# Altium integrated library Electro-Mech.IntLib: 140 symbols (continued)
## MIC-POM-2246P-C33-R_THP
designator MIC?, comment Part Number: POM-2246P-C33-R  (hidden comment: MIC-POM-2246P-C33-R)
Microphone 2-10V 0.5mA; Manufacturer: PUIAUDIO; Package: POM-2246P-C33-R; EDM-PN: *; Text2: *; Text1: *; Value: POM-2246P-C33-R
footprint POM-2246P-C33-R (POM-2246P-C33-R 6.0x6.0mm)
pins: 1 +, 2 -

## MIC-RS 724-3134
designator MIC?, comment RS 724-3134
Microphone 1.5-10V; Manufacturer: RS; Package: MIC-RS 724-3134; EDM-PN: *; Text2: *; Text1: *; Value: RS 724-3134; Part Number: RS 724-3134
footprint MIC-CMA-6542PF (CMA-6542PF 9.7x9.7mm)
pins: 1 +, 2 -

## MIC-WP-23501-000
designator MIC?, comment WP-23501-000
Microphone Electret Condenser 1.3V - 10V Noise Cancelling; Manufacturer: knowles; EDM-PN: MIC18; Package: MIC-WP-23501-000; Text2: *; Text1: *; Value: WP-23501-000; Part Number: WP-23501-000
footprint MIC-WP-23501-000 (WP-23501-000 5.56x3.99mm)
pins: 1 POS, 2 SIG, 3 NEG

## MIC-WP-23501-000-Body-2mm
designator MIC?, comment WP-23501-000  (mechanical)
Microphone Electret Condenser 1.3V - 10V Noise Cancelling; Manufacturer: knowles; EDM-PN: MIC18; Package: MIC-WP-23501-000; Text2: *; Text1: *; Value: WP-23501-000; Part Number: WP-23501-000
footprint MIC-WP-23501-000-2MM (WP-23501-000 5.56x3.99mm)
text: 1-POS; 2-SIG; 3-NEG

## Motor-316040005
designator MOT?, comment 316040005
Motor Vibration 1.3V; Manufacturer: Seeed; Package: Motor-316040005; EDM-PN: *; Text2: *; Text1: *; Value: 316040005; Part Number: 316040005
footprint Motor-316040005 (316040005 14.2x6.6mm)
pins: 1, 2, 3 B, 4 B
text: MOT

## Motor-C1026B002F
designator MOT?  Part Number: C1026B002F  (hidden comment: Motor-C1026B002F)
Motor Vibration 3.0V; Manufacturer: JinLong Machinery; Package: VIB-C1026B002F; EDM-PN: *; Text2: *; Text1: *; Value: C1026B002F
footprint VIB-C1026B002F (C1026B002F 10.0x10.0mm)
pins: 1 +, 2 -
text: MOT

## Motor-KHN4NX1RC
designator MOT?  Part Number: KHN4NX1RC  (hidden comment: Motor-KHN4NX1RC)
Motor Vibration 1.3V; Manufacturer: NMB-MAT; Package: MOT-KHN4NX; EDM-PN: *; Text2: *; Text1: *; Value: KHN4NX1RC
footprint MOT-KHN4NX (KHN4NX1RC 15.5x4.5mm)
pins: 1, 2, 3 B
text: MOT

## Motor-Z4NC1A1591901
designator MOT?  Part Number: Z4NC1A1591901  (hidden comment: Motor-Z4NC1A1591901)
Motor Vibration 1.3V; Manufacturer: KOTL; Package: MOT-Z4NC1A1591901; EDM-PN: *; Text2: *; Text1: *; Value: Z4NC1A1591901
footprint MOT-Z4NC1A1591901 (Z4NC1A1591901 12.8x4.5mm)
pins: 1, 2, 3 B
text: MOT

## Motor-Z4NC1A1591901-MOD
designator MOT?  value Z4NC1A1591901-MOD  (hidden comment: Motor-Z4NC1A1591901-MOD)
Motor Vibration 1.3V; Manufacturer: KOTL; Package: MOT-Z4NC1A1591901; EDM-PN: *; Text2: *; Text1: *; Part Number: Z4NC1A1591901
footprint MOT-Z4NC1A1591901-MOD (Z4NC1A1591901 12.8x4.5mm)
pins: 1, 2, 3 B
text: MOT

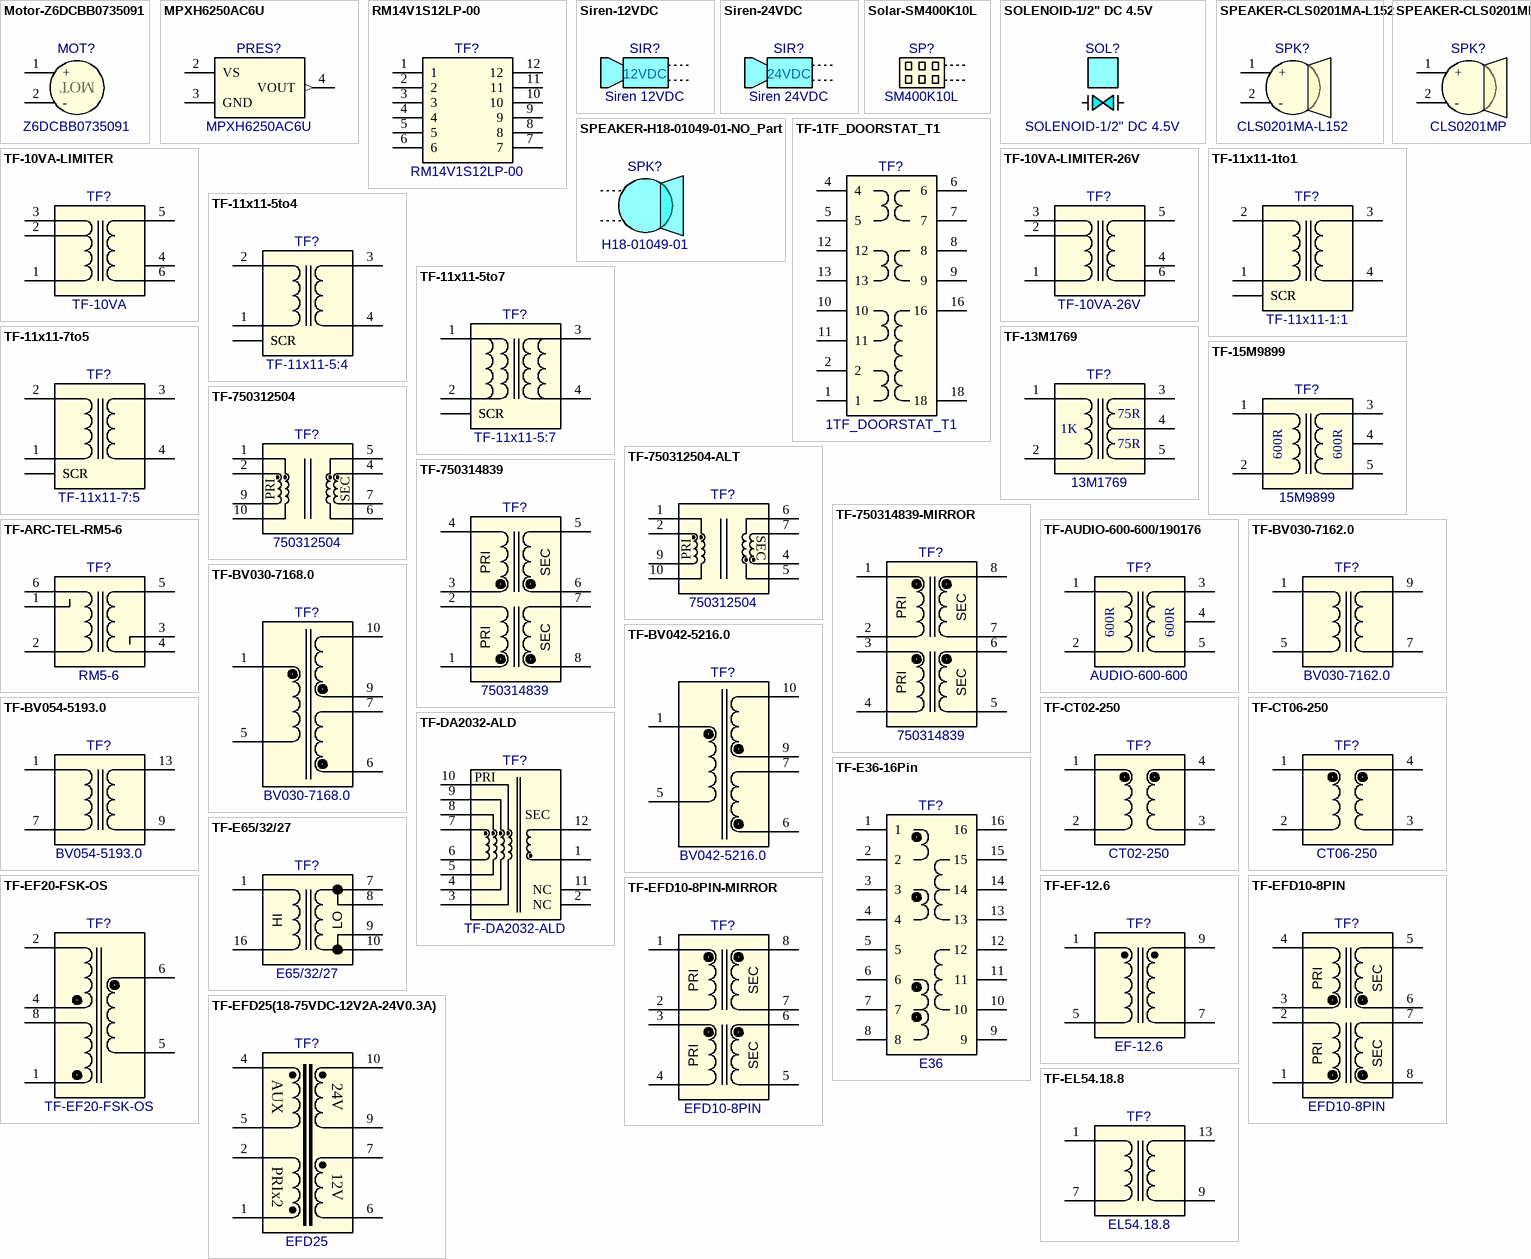
[diagram p2: symbols Motor-Z6DCBB0735091 to TF-EL54.18.8]

## Motor-Z6DCBB0735091
designator MOT?, comment Z6DCBB0735091
Motor Vibration 3.0V; Manufacturer: JinLong Machinery; Package: Motor-Z6DCBB0735091; EDM-PN: *; Text2: *; Text1: *; Value: Z6DCBB0735091; Part Number: Z6DCBB0735091
footprint Motor-Z6DCBB0735091 (Z6DCBB0735091 18.8x6.8mm)
pins: 1 +, 2 -
text: MOT

## MPXH6250AC6U
designator PRES?
Presuure Sensor 20 to 250kPa; Manufacturer: Freescale; Package: SSOP-1317A-03; EDM-PN: *; Text2: *; Text1: *; Value: MPXH6250AC6U; Part Number: MPXH6250AC6U
footprint SSOP-1317A-03 (Variable Resistor, BI Technologies, Straight SMD)
pins: 2 VS (power), 3 GND (power), 4 VOUT (out)

## RM14V1S12LP-00
designator TF?
Transformer RM14; Manufacturer: Miles-Platts; Package: TRM14-12-DIL; EDM-PN: *; Text2: *; Text1: *; Value: RM14V1S12LP-00; Part Number: RM14V1S12LP-00
footprint RM14-12-DIL (RM14 12 Pin 31.4x35.56mm)
pins: 1, 2, 3, 4, 5, 6, 7, 8, 9, 10, 11, 12

## Siren-12VDC
designator SIR?  value 12VDC  (hidden comment: Siren-12VDC)  (mechanical)
Siren 12VDC; Manufacturer: Various; Package: NA; EDM-PN: *; Text2: *; Text1: *; Part Number: Siren 12VDC

## Siren-24VDC
designator SIR?  value 24VDC  (hidden comment: Siren-24VDC)  (mechanical)
Siren 24VDC; Manufacturer: Various; Package: NA; EDM-PN: *; Text2: *; Text1: *; Part Number: Siren 24VDC

## Solar-SM400K10L
designator SP?, comment SM400K10L
Siren 24VDC; Manufacturer: IXYS; Package: SOLAR-SM400K10L; EDM-PN: *; Text2: *; Text1: *; Part Number: SM400K10L; Value: SM400K10L
footprint SOLAR-SM400K10L (SM400K10L 33.0x15.0mm)

## SOLENOID-1/2" DC 4.5V
designator SOL?  (mechanical)
Solenoid Valve 1/2" DC 4.5V; Manufacturer: Various; Package: NA; EDM-PN: *; Text2: *; Text1: *; Value: SOLENOID-1/2" DC 4.5V; Part Number: SOLENOID-1/2" DC 4.5V

## SPEAKER-CLS0201MA-L152
designator SPK?, comment CLS0201MA-L152
Speaker 8 Ohm 500mW; Manufacturer: CUI; Package: SPK-CLS0201MA-L152; EDM-PN: *; Text2: *; Text1: *; Value: CLS0201MA-L152; Part Number: CLS0201MA-L152
footprint SPK-CLS0201MA-L152 (CLS0201MA-L152 20x20mm)
pins: 1 +, 2 -

## SPEAKER-CLS0201MP
designator SPK?, comment CLS0201MP
Speaker 8 Ohm 100mW; Manufacturer: CUI; Package: SPK-CLS0201MP; EDM-PN: *; Text2: *; Text1: *; Value: CLS0201MP; Part Number: CLS0201MP
footprint SPK-CLS0201MP (CLS0201MP 20x20mm)
pins: 1 +, 2 -

## SPEAKER-H18-01049-01-NO_Part
designator SPK?, comment H18-01049-01  (mechanical)
Speaker 16 Ohm 3mW; Manufacturer: Shenzhenshi Hite Sound; EDM-PN: SPK7; Package: NA; Text2: *; Text1: *; Value: H18-01049-01; Part Number: H18-01049-01

## TF-1TF_DOORSTAT_T1
designator TF?  value 1TF_DOORSTAT_T1  (hidden comment: TF-1TF_DOORSTAT_T1)
Transformer 1TF_Doorstat_T1; Manufacturer: DJC Systems; Package: TF-ETD44-Dooralarm; EDM-PN: *; Text2: *; Text1: *; Part Number: 1TF_DOORSTAT_T1
footprint TF-ETD44-Dooralarm
pins: 1, 2, 4, 5, 6, 7, 8, 9, 10, 11, 12, 13, 16, 18

## TF-10VA-LIMITER
designator TF?  value TF-10VA  (hidden comment: TF-10VA-LIMITER)
Transformer PCB Mount 10VA; Manufacturer: Owner; Package: TF-10VA-74x47x39-6Pin(LIM); EDM-PN: *; Text2: *; Text1: *; Part Number: TF-10VA-LIMITER
footprint TF-10VA-74x47x39-6Pin(LIM) (TF-10VA 74.0x47.0mm)
pins: 1, 2, 3, 4, 5, 6

## TF-10VA-LIMITER-26V
designator TF?  value TF-10VA-26V  (hidden comment: TF-10VA-LIMITER-26V)
Transformer PCB Mount 10VA 26V; Manufacturer: Owner; Part Number: TF-10VA-LIMITER 26V; Package: TF-10VA-74x47x39-6Pin(LIM); EDM-PN: *; Text2: *; Text1: *
footprint TF-10VA-74x47x39-6Pin(LIM) (TF-10VA 74.0x47.0mm)
pins: 1, 2, 3, 4, 5, 6

## TF-11x11-1to1
designator TF?  value TF-11x11-1:1  (hidden comment: TF-11x11-1to1)
Transformer 1:1; Manufacturer: Owner; Package: TF 11X11-4PIN; EDM-PN: *; Text2: *; Text1: *; Part Number: TF-11x11-1:1
footprint TF 11X11-4PIN (Transformer 11x11mm)
pins: 1, 2, 3, 4, M1 SCR, M2 SCR

## TF-11x11-5to4
designator TF?  value TF-11x11-5:4  (hidden comment: TF-11x11-5to4)
Transformer 5:4; Manufacturer: Owner; Package: TF 11X11-4PIN; EDM-PN: *; Text2: *; Text1: *; Part Number: TF-11x11-5:4
footprint TF 11X11-4PIN (Transformer 11x11mm)
pins: 1, 2, 3, 4, M1 SCR, M2 SCR

## TF-11x11-5to7
designator TF?  value TF-11x11-5:7  (hidden comment: TF-11x11-5to7)
Transformer 5:7 Dual Coil; Manufacturer: Owner; Package: TF 11X11-4PIN-11; EDM-PN: *; Text2: *; Text1: *; Part Number: TF-11x11-5:7
footprint TF 11X11-4PIN-11 (Transformer 11x11mm)
pins: 1, 2, 3, 4, M1 SCR, M2 SCR

## TF-11x11-7to5
designator TF?  value TF-11x11-7:5  (hidden comment: TF-11x11-7to5)
Transformer 7:5; Manufacturer: Owner; Package: TF 11X11-4PIN; EDM-PN: *; Text2: *; Text1: *; Part Number: TF-11x11-7:5
footprint TF 11X11-4PIN (Transformer 11x11mm)
pins: 1, 2, 3, 4, M1 SCR, M2 SCR

## TF-13M1769
designator TF?, comment 13M1769
Transformer Audio Impedance match; Manufacturer: Mantech; EDM-PN: TRF31; Package: TF-88-900; Text2: *; Text1: *; Part Number: 13M1769; Value: 13M1769
footprint TF-88-900 (88-900)
pins: 1, 2, 3, 4, 5
text: 75R; 1K

## TF-15M9899
designator TF?, comment 15M9899
Transformer Audio Impedance Match 600/600R; Manufacturer: Mantech/EIE; Part Number: 15M9899/190176; EDM-PN: TRF30; Package: TF-88-900; Text2: *; Text1: *; Value: 15M9899
footprint TF-88-900 (88-900)
pins: 1, 2, 3, 4, 5
text: 600R

## TF-750312504
designator TF?, comment 750312504
Transformer Flyback 1:1 3.0uH 10.8A; Manufacturer: Wurth; Package: TF-750312504; EDM-PN: *; Text2: *; Text1: *; Value: 750312504; Part Number: 750312504
footprint TF-750312504 (750312504 13.46x13.46mm)
pins: 1, 2, 4, 5, 6, 7, 9, 10
text: PRI; SEC

## TF-750312504-ALT
designator TF?, comment 750312504
Transformer Flyback 1:1 3.0uH 10.8A; Manufacturer: Wurth; Package: TF-750312504; EDM-PN: *; Text2: *; Text1: *; Value: 750312504; Part Number: 750312504
footprint TF-750312504 (750312504 13.46x13.46mm)
pins: 1, 2, 4, 5, 6, 7, 9, 10
text: PRI; SEC

## TF-750314839
designator TF?, comment 750314839
Transformer Converters For DC/DC; Manufacturer: Wurth; Package: TF-750314839; EDM-PN: *; Text2: *; Text1: *; Part Number: 750314839; Value: 750314839
footprint TF-750314839 (750314839 9.14x9.78mm)
pins: 1, 2, 3, 4, 5, 6, 7, 8
text: PRI; SEC

## TF-750314839-MIRROR
designator TF?, comment 750314839
Transformer Converters For DC/DC; Manufacturer: Wurth; Package: TF-750314839; EDM-PN: *; Text2: *; Text1: *; Part Number: 750314839; Value: 750314839
footprint TF-750314839 (750314839 9.14x9.78mm)
pins: 1, 2, 3, 4, 5, 6, 7, 8
text: PRI; SEC

## TF-ARC-TEL-RM5-6
designator TF?  value RM5-6  (hidden comment: TF-ARC-TEL-RM5-6)
Transformer PCB Mount RM5 6 Pin; Manufacturer: Arc-Tel; Package: TF-RM5-6Pin; EDM-PN: *; Text2: *; Text1: *; Part Number: TF-ARC-TEL-RM5-6
footprint TF-RM5-6Pin
pins: 1, 2, 3, 4, 5, 6

## TF-AUDIO-600-600/190176
designator TF?, comment value AUDIO-600-600  (hidden comment: AUDIO-600-600/190176)
Transformer Audio Impedance Match 600/600R; Manufacturer: Mantech/EIE; EDM-PN: TRF30; Package: TF-88-900; Text2: *; Text1: *; Part Number: AUDIO-600-600/190176
footprint TF-88-900 (88-900)
pins: 1, 2, 3, 4, 5
text: 600R

## TF-BV030-7162.0
designator TF?  value BV030-7162.0  (hidden comment: TF-BV030-7162.0)
Transformer PCB Mount 230V 1x9.0V 1.5VA; Manufacturer: Pulse; Package: TF-1.5VA-27.5x32.5x24-4P; EDM-PN: *; Text2: *; Text1: *; Part Number: BV030-7162.0
footprint TF-1.5VA-27.5x32.5x24-4P (TF-1.5VA 27.5x32.5mm)
pins: 1, 5, 7, 9

## TF-BV030-7168.0
designator TF?  value BV030-7168.0  (hidden comment: TF-BV030-7168.0)
Transformer PCB Mount 230V 2x12.0V 1.5VA; Manufacturer: Pulse; Package: TF-1.5VA-27.5x32.5x24-4P; EDM-PN: *; Text2: *; Text1: *; Part Number: BV030-7168.0
footprint TF-1.5VA-27.5x32.5x24-6P (TF-1.5VA 27.5x32.5mm)
pins: 1, 5, 6, 7, 9, 10

## TF-BV042-5216.0
designator TF?  value BV042-5216.0  (hidden comment: TF-BV042-5216.0)
Transformer PCB Mount 230V 2x12.0V 5VA; Manufacturer: Pulse; Package: TF-El42-5VA; EDM-PN: *; Text2: *; Text1: *; Part Number: BV042-5216.0
footprint TF-EL42-5VA (TF-EL42-5VA 38.5x45.5mm)
pins: 1, 5, 6, 7, 9, 10

## TF-BV054-5193.0
designator TF?  value BV054-5193.0  (hidden comment: TF-BV054-5193.0)
Transformer PCB Mount 230V 1x12.0V 16VA; Manufacturer: Pulse; Package: TF-16VA; EDM-PN: *; Text2: *; Text1: *; Part Number: BV054-5193.0
footprint TF-EL54-16VA (TF-EL54-16VA 48.0x57.0mm)
pins: 1, 7, 9, 13

## TF-CT02-250
designator TF?, comment CT02-250
Transformer Current Sense; Manufacturer: ICE Components; Package: TF-CT02 Series; EDM-PN: *; Text2: *; Text1: *; Part Number: CT02-250; Value: CT02-250
footprint TF-CT02 Series (CT02 6.0x6.4mm)
pins: 1, 2, 3, 4

## TF-CT06-250
designator TF?, comment CT06-250
Transformer Current Sense; Manufacturer: ICE Components; Package: TF-CT06 Series; EDM-PN: *; Text2: *; Text1: *; Part Number: CT06-250; Value: CT06-250
footprint TF-CT06 Series (CT06 6.7x6.5mm)
pins: 1, 2, 3, 4

## TF-DA2032-ALD
designator TF?
Transformer Flyback; Manufacturer: Coilcraft; Package: TF-DA2032-ALD; EDM-PN: *; Text2: *; Text1: *; Value: TF-DA2032-ALD; Part Number: TF-DA2032-ALD
footprint TF-DA2032-ALD (DA2032-ALD 14.98x17.2mm)
pins: 1, 2 NC, 3, 4, 5, 6, 7, 8, 9, 10, 11 NC, 12
text: PRI; SEC

## TF-E36-16Pin
designator TF?  value E36  (hidden comment: TF-E36-16Pin)
Transformer DBEE360020; Manufacturer: Owner; Package: TF-ETD44-Dooralarm; EDM-PN: *; Text2: *; Text1: *; Part Number: E36
footprint TF-E36-16PIN-8+8 (E36 37x38mm)
pins: 1, 2, 3, 4, 5, 6, 7, 8, 9, 10, 11, 12, 13, 14, 15, 16

## TF-E65/32/27
designator TF?, comment E65/32/27
Transformer PCB Mount E65/32/27; Manufacturer: Owner; Package: TF-E65-32-27; EDM-PN: *; Text2: *; Text1: *; Part Number: E65/32/27; Value: E65/32/27
footprint TF-E65-32-27 (E65-32-27 42x49mm)
pins: 1, 7, 8, 9, 10, 16
text: HI; LO

## TF-EF20-FSK-OS
designator TF?
Transformer PCB Mount Offline Switcher; Manufacturer: FSK; Package: TF-EF20-8PIN-X7; EDM-PN: *; Text2: *; Text1: *; Value: TF-EF20-FSK-OS; Part Number: TF-EF20-FSK-OS
footprint TF-EF20-8PIN-X7 (EF20 20.5x20.5mm)
pins: 1, 2, 4, 5, 6, 8

## TF-EF-12.6
designator TF?, comment EF-12.6
Transformer PCB Mount SMD; Manufacturer: Pin Shine; Package: TF-EF12.6-S; EDM-PN: *; Text2: *; Text1: *; Part Number: EF-12.6; Value: EF-12.6
footprint TF-EF12.6-S (EF12.6-S 17.7x13.0mm)
pins: 1, 5, 7, 9

## TF-EFD10-8PIN
designator TF?  value EFD10-8PIN  (hidden comment: TF-EFD10-8PIN)
Transformer Converters For DC/DC; Manufacturer: Owner; Package: TF-EFD10; EDM-PN: *; Text2: *; Text1: *; Part Number: EFD10-8PIN
footprint TF-EFD10 (EFD10)
pins: 1, 2, 3, 4, 5, 6, 7, 8
text: PRI; SEC

## TF-EFD10-8PIN-MIRROR
designator TF?, comment value EFD10-8PIN  (hidden comment: TF-EFD10-8PIN)
Transformer Converters For DC/DC; Manufacturer: Owner; Package: TF-EFD10; EDM-PN: *; Text2: *; Text1: *; Part Number: EFD10-8PIN
footprint TF-EFD10 (EFD10)
pins: 1, 2, 3, 4, 5, 6, 7, 8
text: PRI; SEC

## TF-EFD25(18-75VDC-12V2A-24V0.3A)
designator TF?, comment value EFD25  (hidden comment: EFD25(18-75VDC-12V2A-24V0.3A))
Transformer Fly-Back-32_72kHz; Manufacturer: Microtronix; Package: TF-EFD25-5x5; EDM-PN: *; Text2: *; Text1: *; Part Number: EFD25(18-75VDC-12V2A-24V0.3A)
footprint TF-EFD25-5x5 (EFD25-5x5)
pins: 1 Pa, 2 Pb, 4 S3b, 5 S3a, 6 S1a, 7 S1b, 9 S2b, 10 S2a
text: AUX; 24V; PRIx2; 12V

## TF-EL54.18.8
designator TF?  value EL54.18.8  (hidden comment: TF-EL54.18.8)
Transformer PCB Mount 230V 1x12.0V 16VA; Manufacturer: ERA; Package: TF-16VA; EDM-PN: *; Text2: *; Text1: *; Part Number: EL54.18.8
footprint TF-EL54-16VA (TF-EL54-16VA 48.0x57.0mm)
pins: 1, 7, 9, 13

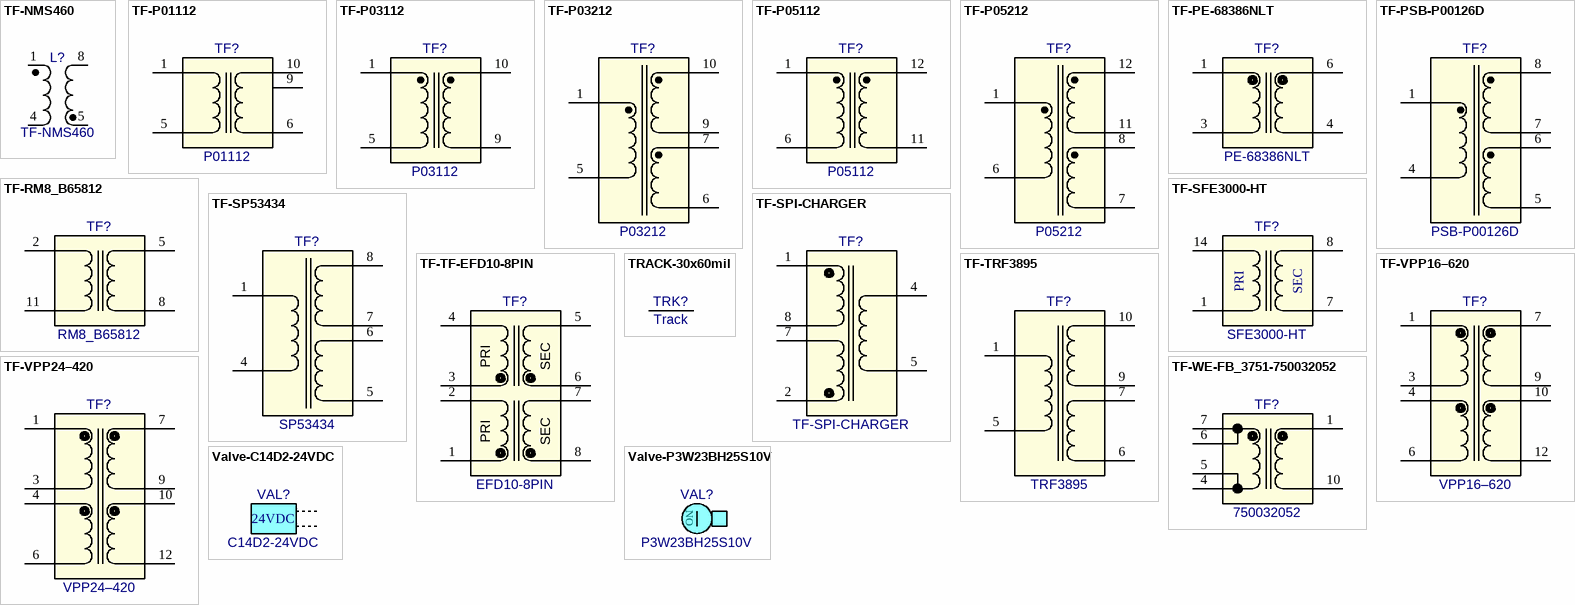
[diagram p3: symbols TF-NMS460 to Valve-P3W23BH25S10V]

## TF-NMS460
designator L?
Transformer NMS460 (EFD15 Core); Manufacturer: Xavant; Part Number: TF-NMS460; Package: TF-NMS460; EDM-PN: *; Text1: *; Text2: EFD15; Value: TF-NMS460
footprint TF-NMS460 (TF NMS460 15.5x15.5mm)
pins: 1 P1, 4 P2, 5 S1, 8 S2

## TF-P01112
designator TF?, comment P01112
Transformer PCB Mount 230V 1x12.0V 1.5VA; Manufacturer: ACDC; Package: TF-1.5VA-27.5x32.5x24-5P; EDM-PN: *; Text2: *; Text1: *; Part Number: P01112; Value: P01112
footprint TF-1.5VA-27.5x32.5x24-5P (TF-1.5VA 27.5x32.5mm)
pins: 1, 5, 6, 9, 10

## TF-P03112
designator TF?  value P03112  (hidden comment: TF-P03112)
Transformer PCB Mount 230V 1x12.0V 3VA; Manufacturer: ACDC; Package: TF-3VA-63x38x33-5pin; EDM-PN: *; Text2: *; Text1: *; Part Number: P03112
footprint TF-3VA-63x38x33-5pin (TF-3VA 63.0x38.0mm)
pins: 1, 5, 9, 10

## TF-P03212
designator TF?  value P03212  (hidden comment: TF-P03212)
Transformer PCB Mount 230V 2x12.0V 3VA; Manufacturer: ACDC; Package: TF-3VA-63x38x33-6pin; EDM-PN: *; Text2: *; Text1: *; Part Number: P03212
footprint TF-3VA-63x38x33-6pin (TF-3VA 63.0x38.0mm)
pins: 1, 5, 6, 7, 9, 10

## TF-P05112
designator TF?  value P05112  (hidden comment: TF-P05112)
Transformer PCB Mount 230V 1x12.0V 5.5VA; Manufacturer: ACDC; Package: TF-5.5VA-69x43x38-5pin; EDM-PN: *; Text2: *; Text1: *; Part Number: P05112
footprint TF-5.5VA-69x43x38-5pin (TF-5.5VA 69.0x43.0mm)
pins: 1, 6, 11, 12

## TF-P05212
designator TF?  value P05212  (hidden comment: TF-P05212)
Transformer PCB Mount 230V 2x12.0V 5.5VA; Manufacturer: ACDC; Package: TF-5.5VA-69x43x38-8pin; EDM-PN: *; Text2: *; Text1: *; Part Number: P05212
footprint TF-5.5VA-69x43x38-8pin (TF-5.5VA 69.0x43.0mm)
pins: 1, 6, 7, 8, 11, 12

## TF-PE-68386NLT
designator TF?, comment PE-68386NLT
Transformer Gate Drive 785uH 1:1; Manufacturer: Pulse; Package: TF-PE-68386NLT; EDM-PN: *; Text2: *; Text1: *; Part Number: PE-68386NLT; Value: PE-68386NLT
footprint TF-PE-68386NLT (PE-68386NLT 8.6x6.73mm)
pins: 1, 3, 4, 6

## TF-PSB-P00126D
designator TF?  value PSB-P00126D  (hidden comment: TF-PSB-P00126D)
Transformer PCB Mount 230V 18+18V 0.6VA; Manufacturer: Premier Magnetics; Package: TF-E20-8PIN-4+4-PSB; EDM-PN: *; Text2: *; Text1: *; Part Number: PSB-P00126D
footprint TF-E20-8PIN-4+4-PSB (E20 24.0x23.0mm)
pins: 1, 4, 5, 6, 7, 8

## TF-RM8_B65812
designator TF?, comment RM8_B65812
Transformer PCB Mount RM8 12 Pin; Manufacturer: Owner; Package: TF-RM8-12P; EDM-PN: *; Text2: *; Text1: *; Part Number: RM8_B65812; Value: RM8_B65812
footprint TF-RM8-12P (RM8 12Pin)
pins: 2, 5, 8, 11

## TF-SFE3000-HT
designator TF?  value SFE3000-HT  (hidden comment: TF-SFE3000-HT)
Transformer PCB Mount; Manufacturer: Owner; Package: TF-ETD34; EDM-PN: *; Text2: *; Text1: *; Part Number: SFE3000-HT
footprint TF-ETD34 (ETD34 39.6x41.8mm)
pins: 1, 7, 8, 14
text: PRI; SEC

## TF-SP53434
designator TF?  value SP53434  (hidden comment: TF-SP53434)
Transformer PCB Mount 230V 15+15V 12VA; Manufacturer: RS; Part Number: 504-678; Package: TF-SP53434; EDM-PN: *; Text2: *; Text1: *
footprint TF-ST53434 (TF SS53434 54.0x45.0mm)
pins: 1, 4, 5, 6, 7, 8

## TF-SPI-CHARGER
designator TF?
Transformer PCB Mount SPI Charger; Manufacturer: SPI; Package: TF-EF20-8PIN; EDM-PN: *; Text2: *; Text1: *; Value: TF-SPI-CHARGER; Part Number: TF-SPI-CHARGER
footprint TF-EF20-8PIN-X3X6 (Transformer EF20 8 Pin PCB Mount - no Pin 3 and 6)
pins: 1, 2, 4, 5, 7, 8

## TF-TF-EFD10-8PIN
designator TF?, comment value EFD10-8PIN  (hidden comment: TF-EFD10-8PIN)
Transformer Converters For DC/DC; Manufacturer: Owner; Package: TF-EFD10; EDM-PN: *; Text2: *; Text1: *; Part Number: EFD10-8PIN
footprint TF-EFD10 (EFD10)
pins: 1, 2, 3, 4, 5, 6, 7, 8
text: PRI; SEC

## TF-TRF3895
designator TF?  value TRF3895  (hidden comment: TF-TRF3895)
Transformer 2VA 50Hz 230/2x17.5V; Manufacturer: Communica; Package: TF-2VA-35x42x28-6P; EDM-PN: *; Text2: *; Text1: *; Part Number: TRF3895
footprint TF-2VA-35x42x28-6P (TF 2VA 35.0x42.0mm)
pins: 1, 5, 6, 7, 9, 10

## TF-VPP16–620
designator TF?, comment VPP16–620
Transformer 230VAC 10VA - 16V 0.62A/2x8V 1.25A; Manufacturer: Triad Magnetics; Package: TF-VPP16–620; EDM-PN: *; Text2: *; Text1: *; Part Number: VPP16–620; Value: VPP16–620
footprint TF-VPP16-620 (VPP16-620 39.67x47.625mm)
pins: 1, 3, 4, 6, 7, 9, 10, 12

## TF-VPP24–420
designator TF?, comment VPP24–420
Transformer 230VAC 10VA - 24V 0.42A/2x12V 0.84A; Manufacturer: Triad Magnetics; Package: TF-VPP24-420; EDM-PN: *; Text2: *; Text1: *; Part Number: VPP24–420; Value: VPP24–420
footprint TF-VPP24-420 (VPP24-420 39.67x47.6mm)
pins: 1, 3, 4, 6, 7, 9, 10, 12

## TF-WE-FB_3751-750032052
designator TF?  value 750032052  (hidden comment: TF-WE-FB_3751-750032052)
Transformer Flyback for LT3751 WE-FB 3751; Manufacturer: Wurth; Package: TF-WE-FB-EFD20; EDM-PN: *; Text2: *; Text1: *; Part Number: 750032052
footprint TF-WE-FB-EFD20 (WE-FB-EFD20 28.7x21.97mm)
pins: 1, 4, 5, 6, 7, 10

## TRACK-30x60mil
designator TRK?, comment Part Number: Track  (hidden comment: Track 30mil)
Presuure Sensor 20 to 250kPa; Manufacturer: NA; Value: Track 30x60mil; Package: TRACK-30X60; EDM-PN: *; Text2: *; Text1: *
footprint TRACK-30x60mil (Track 30mil Wide 60mil Long)
pins: 1, 2

## Valve-C14D2-24VDC
designator VAL?, comment C14D2-24VDC  (mechanical)
Solenoid Coil 24VDC for P3W23/P2W/P5W/PLP/PLA; Manufacturer: Pneumatron; Package: NA; EDM-PN: *; Text2: *; Text1: *; Value: C14D2-24VDC; Part Number: C14D2-24VDC
text: 24VDC

## Valve-P3W23BH25S10V
designator VAL?, comment P3W23BH25S10V  (mechanical)
Valve Solenoid NO; Manufacturer: Pneumatron; Package: NA; EDM-PN: *; Text2: *; Text1: *; Value: P3W23BH25S10V; Part Number: P3W23BH25S10V
text: NO